# Altium footprint library SVP_Shared.PcbLib: 57 footprints (part 3 of 4)
Each footprint in its own frame and in the unit in brackets; x right, y up, seen from the top. Pads: shape width x height; smd on the part's side, far side on the other; paste and mask are expansions set on the pad; w line width, h text height; cw(c..) or ccw(c..) is an arc to the next point about the centre after c.
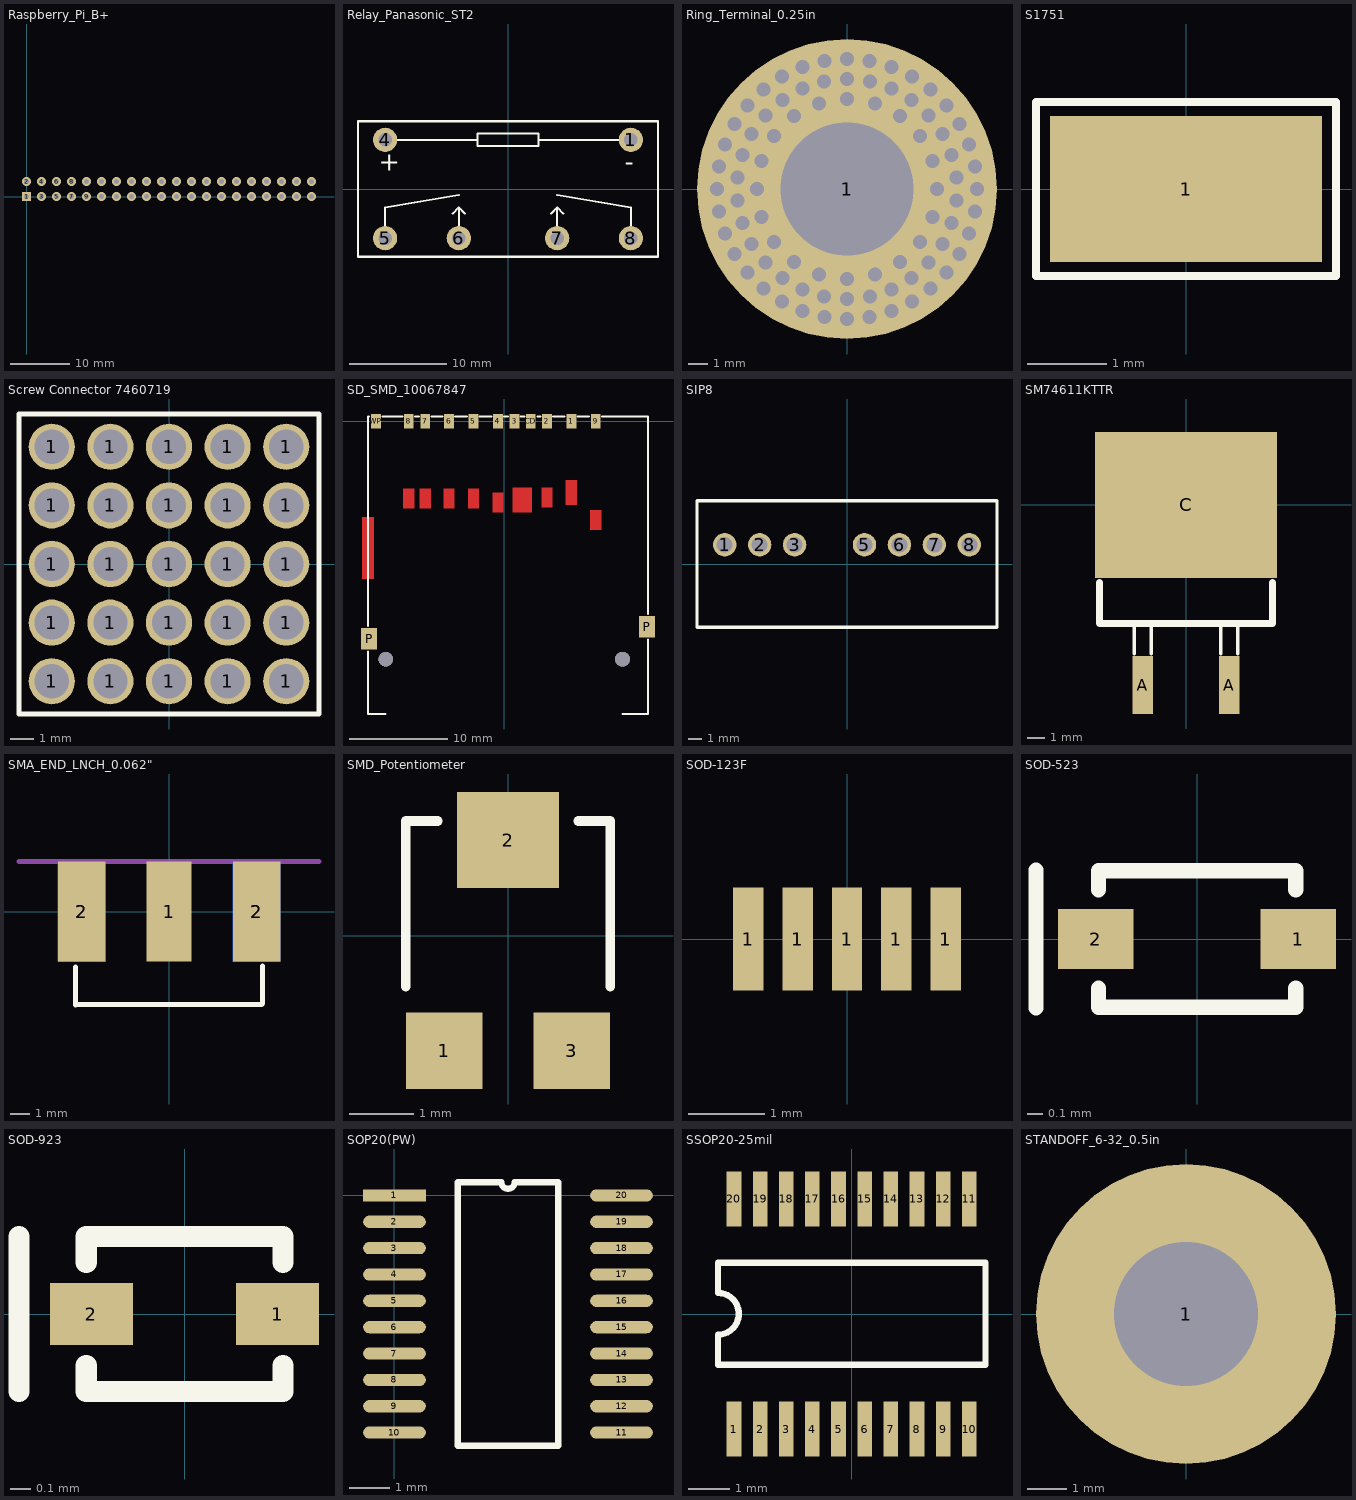
[diagram p2: the footprints below, top view; thin cyan lines are the x and y axes]

## Raspberry_Pi_B+ [mm]
pads (40):
  rect 1.5x1.5 hole 0.9: 1(0,0)
  round 1.5 hole 0.9: 2(0,2.54) 3(2.54,0) 4(2.54,2.54) 5(5.08,0) 6(5.08,2.54) 7(7.62,0) 8(7.62,2.54) 9(10.16,0) 10(10.16,2.54) 11(12.7,0) 12(12.7,2.54) 13(15.24,0) 14(15.24,2.54) 15(17.78,0) 16(17.78,2.54) 17(20.32,0) 18(20.32,2.54) 19(22.86,0) 20(22.86,2.54) 21(25.4,0) 22(25.4,2.54) 23(27.94,0) 24(27.94,2.54) 25(30.48,0) 26(30.48,2.54) 27(33.02,0) 28(33.02,2.54) 29(35.56,0) 30(35.56,2.54) 31(38.1,0) 32(38.1,2.54) 33(40.64,0) 34(40.64,2.54) 35(43.18,0) 36(43.18,2.54) 37(45.72,0) 38(45.72,2.54) 39(48.26,0) 40(48.26,2.54)
Bottom Overlay:
  lines w0.2: -1.27,-1.27 -1.27,3.81 49.53,3.81 49.53,-1.27 -1.27,-1.27
3D body "User Library-RaspberryPi2 STEP214.STEP": height 6.71, standoff -12.04, extent -10.262,-53.525 79.358,4.775

## Relay_Panasonic_ST2 [mm] "General Purpose Relay Through Hole"
pads (6):
  round 2.5 hole 1.4: 1(12.7,5.08) 4(-12.7,5.08) 5(-12.7,-5.08) 6(-5.08,-5.08) 7(5.08,-5.08) 8(12.7,-5.08)
Top Overlay:
  lines w0.203: -12.7,-3.81 -12.7,-1.905 -5.08,-0.635 ; -11.43,5.08 -3.175,5.08 ; -5.715,-2.54 -5.08,-1.905 ; -5.08,-3.81 -5.08,-1.905 ; -4.445,-2.54 -5.08,-1.905 ; 4.445,-2.54 5.08,-1.905 ; 5.08,-3.81 5.08,-1.905 ; 5.08,-0.635 12.7,-1.905 12.7,-3.81 ; 5.715,-2.54 5.08,-1.905 ; 11.43,5.08 3.175,5.08 ; -3.175,5.08 -3.175,5.715 0,5.715 3.175,5.715 3.175,5.08 ; -3.175,5.08 -3.175,4.445 0,4.445 3.175,4.445 3.175,5.08
  lines w0.254: -15.5,-7 -15.5,7 15.5,7 15.5,-7 -15.5,-7
  text "-" at 12.065,1.905 h1.91
  text "+" at -13.335,1.905 h1.91
3D body: height 11.3, standoff 0.3, extent -15.5,-7 15.5,7

## Ring_Terminal_0.25in [mil]
pads (1):
  round 600 hole 266: 1(0,0)
via 0,-260 diameter 50 hole 28
via -45.15,-256.05 diameter 50 hole 28
via -88.93,-244.32 diameter 50 hole 28
via -130,-225.17 diameter 50 hole 28
via -167.12,-199.17 diameter 50 hole 28
via -199.17,-167.12 diameter 50 hole 28
via -225.17,-130 diameter 50 hole 28
via -244.32,-88.93 diameter 50 hole 28
via -256.05,-45.15 diameter 50 hole 28
via 0,-220 diameter 50 hole 28
via -45.74,-215.19 diameter 50 hole 28
via -89.48,-200.98 diameter 50 hole 28
via -129.31,-177.98 diameter 50 hole 28
via -163.49,-147.21 diameter 50 hole 28
via -190.53,-110 diameter 50 hole 28
via -209.23,-67.98 diameter 50 hole 28
via -218.79,-23 diameter 50 hole 28
via -218.79,23 diameter 50 hole 28
via -209.23,67.98 diameter 50 hole 28
via -190.53,110 diameter 50 hole 28
via -163.49,147.21 diameter 50 hole 28
via -129.31,177.98 diameter 50 hole 28
via -89.48,200.98 diameter 50 hole 28
via -45.74,215.19 diameter 50 hole 28
via -45.15,256.05 diameter 50 hole 28
via -88.93,244.32 diameter 50 hole 28
via -130,225.17 diameter 50 hole 28
via -167.12,199.17 diameter 50 hole 28
via -199.17,167.12 diameter 50 hole 28
via -225.17,130 diameter 50 hole 28
via -244.32,88.93 diameter 50 hole 28
via -256.05,45.15 diameter 50 hole 28
via -260,0 diameter 50 hole 28
via 0,-180 diameter 50 hole 28
via -55.62,-171.19 diameter 50 hole 28
via -105.8,-145.62 diameter 50 hole 28
via -145.62,-105.8 diameter 50 hole 28
via -171.19,-55.62 diameter 50 hole 28
via -180,0 diameter 50 hole 28
via -171.19,55.62 diameter 50 hole 28
via -145.62,105.8 diameter 50 hole 28
via -105.8,145.62 diameter 50 hole 28
via -55.62,171.19 diameter 50 hole 28
via 55.62,-171.19 diameter 50 hole 28
via 105.8,-145.62 diameter 50 hole 28
via 145.62,-105.8 diameter 50 hole 28
via 171.19,-55.62 diameter 50 hole 28
via 180,0 diameter 50 hole 28
via 171.19,55.62 diameter 50 hole 28
via 145.62,105.8 diameter 50 hole 28
via 105.8,145.62 diameter 50 hole 28
via 55.62,171.19 diameter 50 hole 28
via 0,180 diameter 50 hole 28
via 260,0 diameter 50 hole 28
via 256.05,-45.15 diameter 50 hole 28
via 244.32,-88.93 diameter 50 hole 28
via 225.17,-130 diameter 50 hole 28
via 199.17,-167.12 diameter 50 hole 28
via 167.12,-199.17 diameter 50 hole 28
via 130,-225.17 diameter 50 hole 28
via 88.93,-244.32 diameter 50 hole 28
via 45.15,-256.05 diameter 50 hole 28
via 45.74,-215.19 diameter 50 hole 28
via 89.48,-200.98 diameter 50 hole 28
via 129.31,-177.98 diameter 50 hole 28
via 163.49,-147.21 diameter 50 hole 28
via 190.53,-110 diameter 50 hole 28
via 209.23,-67.98 diameter 50 hole 28
via 218.79,-23 diameter 50 hole 28
via 218.79,23 diameter 50 hole 28
via 209.23,67.98 diameter 50 hole 28
via 190.53,110 diameter 50 hole 28
via 163.49,147.21 diameter 50 hole 28
via 129.31,177.98 diameter 50 hole 28
via 89.48,200.98 diameter 50 hole 28
via 45.74,215.19 diameter 50 hole 28
via 0,220 diameter 50 hole 28
via 256.05,45.15 diameter 50 hole 28
via 244.32,88.93 diameter 50 hole 28
via 225.17,130 diameter 50 hole 28
via 199.17,167.12 diameter 50 hole 28
via 167.12,199.17 diameter 50 hole 28
via 130,225.17 diameter 50 hole 28
via 88.93,244.32 diameter 50 hole 28
via 45.15,256.05 diameter 50 hole 28
via 0,260 diameter 50 hole 28

## S1751 [mm] "PC TEST POINT TIN SMD 1K"
height 2
pads (1):
  rect 3.45x1.85 smd: 1(0,0)
Top Overlay:
  lines w0.1: -1.9,-1.1 -1.9,1.1 1.9,1.1 1.9,-1.1 -1.9,-1.1
3D body "Laird-BMI-C-010-0.STEP": height 1.81, standoff 0.01, extent 0,-0.635 1.5,0.635
3D body "Laird-BMI-C-010-0.STEP": height 1.81, standoff 0.01, extent -1.5,-0.635 0,0.635

## Screw Connector 7460719 [mm]
pads (25):
  round 2 hole 1.475: 1(-5.08,-5.08) 1(-5.08,-2.54) 1(-5.08,0) 1(-5.08,2.54) 1(-5.08,5.08) 1(-2.54,-5.08) 1(-2.54,-2.54) 1(-2.54,0) 1(-2.54,2.54) 1(-2.54,5.08) 1(0,-5.08) 1(0,-2.54) 1(0,0) 1(0,2.54) 1(0,5.08) 1(2.54,-5.08) 1(2.54,-2.54) 1(2.54,0) 1(2.54,2.54) 1(2.54,5.08) 1(5.08,-5.08) 1(5.08,-2.54) 1(5.08,0) 1(5.08,2.54) 1(5.08,5.08)
Top Overlay:
  lines w0.2: -6.5,-6.5 -6.5,6.5 6.5,6.5 6.5,-6.5 -6.5,-6.5
3D body "7460719.stp": height 20.5, standoff -3.5, extent -6.5,-6.5 6.5,6.5

## SD_SMD_10067847 [mm] "CONN SD CARD PUSH-PUSH SMD"
pads (13):
  rect 1x1.5 smd: 1(6.875,0) 2(4.375,0) 3(1.075,0) 4(-0.625,0) 5(-3.125,0) 6(-5.625,0) 7(-8.05,0) 8(-9.75,0) 9(9.375,0) CD(2.725,0) WP(-13.1,0)
  rect 1.6x2.2 smd: P(-13.8,-22.2) P(14.6,-21)
via 12.1,-24.3 diameter 1.5 hole 1.5
via -12.1,-24.3 diameter 1.5 hole 1.5
Top Layer:
  pour cut-out: -10.3,-6.9 -9.2,-6.9 -9.2,-8.9 -10.3,-8.9
  pour cut-out: -8.6,-6.9 -7.5,-6.9 -7.5,-8.9 -8.6,-8.9
  pour cut-out: -6.175,-6.9 -5.075,-6.9 -5.075,-8.9 -6.175,-8.9
  pour cut-out: 8.825,-9.1 9.925,-9.1 9.925,-11.1 8.825,-11.1
  pour cut-out: 6.325,-6 7.425,-6 7.425,-8.5 6.325,-8.5
  pour cut-out: 3.825,-6.775 4.925,-6.775 4.925,-8.775 3.825,-8.775
  pour cut-out: 0.9,-6.8 2.85,-6.8 2.85,-9.3 0.9,-9.3
  pour cut-out: -1.175,-7.3 -0.075,-7.3 -0.075,-9.3 -1.175,-9.3
  pour cut-out: -3.675,-6.9 -2.575,-6.9 -2.575,-8.9 -3.675,-8.9
  pour cut-out: -14.5,-9.8 -13.3,-9.8 -13.3,-16.1 -14.5,-16.1
Top Overlay:
  lines w0.2: -13.9,-23.5 -13.9,-29.9 -12.1,-29.9 ; -13.9,-20.9 -13.9,0.5 -13.8,0.5 ; -12.4,0.5 -10.4,0.5 ; -9.1,0.5 -8.7,0.5 ; -7.4,0.5 -6.3,0.5 ; -5,0.5 -3.8,0.5 ; -2.5,0.5 -1.3,0.5 ; 0,0.5 0.4,0.5 ; 1.7,0.5 2.1,0.5 ; 3.4,0.5 3.7,0.5 ; 5,0.5 6.2,0.5 ; 7.5,0.5 8.7,0.5 ; 10,0.5 14.7,0.5 14.7,-19.7 ; 12.1,-29.9 14.7,-29.9 14.7,-22.3
3D body "User Library-sd card.step": height 2.45, standoff 0.35, extent -12,-35.4 12,-3.4
3D body "10067847011rlf.stp": height 2.91, standoff 0.01, extent -13.825,-29.8 14.625,0.45

## SIP8 [mm]
pads (7):
  round 1.7 hole 1.15: 1(-8.89,1.4) 2(-6.35,1.4) 3(-3.81,1.4) 6(3.81,1.4) 7(6.35,1.4) 8(8.89,1.4)
  round 1.7 hole 1.15 paste+0: 5(1.27,1.4)
Top Overlay:
  lines w0.254: -10.9,-4.6 10.9,-4.6 10.9,4.6 -10.9,4.6 -10.9,-4.6
3D body "User Library-RECOM_RS_Series.SLDPRT": height 3, standoff -11.6, extent -10.9,-4.6 10.9,4.6

## SM74611KTTR [mm] "SM74611KTTR Smart Bypass Diode"
pads (3):
  rect 1.2x3.4 smd: A(-2.54,-10.6) A(2.54,-10.6)
  rect 10.7x8.6 smd: C(0,0)
Top Overlay:
  lines w0.203: -3.048,-8.763 -3.048,-6.985 ; -2.032,-8.763 -2.032,-6.985 ; 2.032,-8.763 2.032,-6.985 ; 3.048,-8.763 3.048,-6.985
  lines w0.406: -5.08,-4.572 -5.08,-6.985 5.08,-6.985 5.08,-4.572
3D body "SW3dPS-TO263-3S.STEP": height 4.81, standoff 0.01, extent -5,-11.848 5,3.822

## SMA_END_LNCH_0.062" [mil] "End Launch SMA CXN for 0.062\" boards"
pads (5):
  rect 90x200 smd: 1(0,0)
  rect 95x200 smd: 2(-175,0) 2(175,0)
  rect 95x200 smd far side: 2(-175,0) 2(175,0)
Top Overlay:
  lines w10: -187.5,-111 -187.5,-186.5 -187,-186 185,-186 187,-184 187,-119 ; 187,-123 187,-109
Bottom Overlay:
  lines w10: -240,90 -240,-200 -230,-210 230,-210 240,-200 240,90 ; -187,-188 -187,-109 ; -185,-188 185,-188 187,-186 187,-108
Mechanical 1:
  lines w10: -300,100 300,100
3D body "User Library-Johnson Components SMA - 50 Ohm Connectors 142-0701-801.step": height 170.51, standoff -141.3, extent -190,-80 184.8,481.81

## SMD_Potentiometer [mm]
height 1.2
pads (3):
  rect 1.2x1.2 smd: 1(-1,-1.8) 3(1,-1.8)
  rect 1.6x1.5 smd: 2(0,1.5)
Top Overlay:
  lines w0.152: -1.6,-0.8 -1.6,1.8 -1.1,1.8 ; 1.1,1.8 1.6,1.8 1.6,-0.8
3D body "User Library-PVZ3A.STEP": height 1.95, standoff 0, extent -1.55,-1.977 1.55,1.713

## SOD-123F [mm]
pads (5):
  rect 0.4x1.35 smd: 1(-1.3,0) 1(-0.65,0) 1(0,0) 1(0.65,0) 1(1.3,0)

## SOD-523 [mm] "SOD-523 Diode"
pads (2):
  rect 0.5x0.4 smd: 1(0.67,0) 2(-0.67,0)
Top Overlay:
  lines w0.102: -1.067,-0.457 -1.067,0.457 ; -0.653,-0.326 -0.653,-0.451 0,-0.451 0.653,-0.451 0.653,-0.326 ; -0.653,0.326 -0.653,0.451 0,0.451 0.653,0.451 0.653,0.326
3D body "User Library-SOD-523F.step": height 0.71, standoff 0.01, extent -0.8,-0.399 0.8,0.399

## SOD-923 [mm] "SOD-923 Diode"
pads (2):
  rect 0.4x0.3 smd: 1(0.45,0) 2(-0.45,0)
Top Overlay:
  lines w0.102: -0.8,-0.375 -0.8,0.375 ; -0.475,-0.25 -0.475,-0.375 0,-0.375 0.475,-0.375 0.475,-0.25 ; -0.475,0.25 -0.475,0.375 0,0.375 0.475,0.375 0.475,0.25
3D body "User Library-DIODE_SOD-923.step": height 0.44, standoff 0.01, extent -0.525,-0.325 0.525,0.325

## SOP20(PW) [mm]
pads (20):
  rect 1.55x0.3 smd: 1(0,0)
  oval 1.55x0.3 smd: 2(0,-0.65) 3(0,-1.3) 4(0,-1.95) 5(0,-2.6) 6(0,-3.25) 7(0,-3.9) 8(0,-4.55) 9(0,-5.2) 10(0,-5.85) 11(5.6,-5.85) 12(5.6,-5.2) 13(5.6,-4.55) 14(5.6,-3.9) 15(5.6,-3.25) 16(5.6,-2.6) 17(5.6,-1.95) 18(5.6,-1.3) 19(5.6,-0.65) 20(5.6,0)
Top Overlay:
  lines w0.152: 1.562,-6.175 1.562,0.325 2.638,0.325 ccw(c2.8,0.325) 2.962,0.325 4.038,0.325 4.038,-6.175 1.562,-6.175
3D body "User Library-TSSOP-20.step": height 1.2, standoff 0, extent -0.481,-6.221 6.069,0.379

## SSOP20-25mil [mil] "Non-Standard SSOP20 (Not Quite 0.65mm pitch)"
pads (20):
  rect 14x53 smd: 1(-112.5,-110) 2(-87.5,-110) 3(-62.5,-110) 4(-37.5,-110) 5(-12.5,-110) 6(12.5,-110) 7(37.5,-110) 8(62.5,-110) 9(87.5,-110) 10(112.5,-110) 11(112.5,110) 12(87.5,110) 13(62.5,110) 14(37.5,110) 15(12.5,110) 16(-12.5,110) 17(-37.5,110) 18(-62.5,110) 19(-87.5,110) 20(-112.5,110)
Top Overlay:
  lines w6: -127.87,-20 -127.87,-48.5 128.03,-48.5 128.03,48.95 -127.87,48.95 -127.87,20 ; -127.87,-19.77 ccw(c-127.87,0.23) -127.87,20.23
3D body "User Library-TSSOP20-TP.STEP": height 47.24, standoff 0, extent -130,-128.94 129.84,128.94

## STANDOFF_6-32_0.5in [mil] "Standoff for 6-32 screw, 0.5 inches tall"
height 500
pads (1):
  round 300 hole 144 paste+0: 1(0,0)
3D body "91274A008_COATED ALLOY STEEL SOCKET HEAD CAP SCREW.STEP": height 138.5, standoff -374.5, extent -112.99,-112.99 113.01,113
3D body "91780A127_ALUM FEM THRDED HEX STANDOFF.STEP": height 500.5, standoff 0.5, extent -124.99,-144.33 125.01,144.34